# Altium integrated library Diode-SMD_V2.IntLib: 415 symbols (part 2 of 2) (continued)
## SK33_SMA
designator D?  Part Number: SK33SMA  (hidden comment: SK33_SMA)
Diode Schottky Rectifier 3Amp 30V; Manufacturer: Diotec; Value: SK33SMA; Package: SMA; EDM-PN: *; Text2: *; Text1: *; SAAB PN: *; DCE Part No: *
footprint SMA (SMA 5.6x2.95mm)
pins: 1 C, 2 A

## SK33_SMB
designator D?  Part Number: SK33SMB  (hidden comment: SK33_SMB)
Diode Schottky Rectifier 3Amp 30V; Manufacturer: Diotec; Value: SK33SMB; Package: SMB; EDM-PN: *; Text2: *; Text1: *; SAAB PN: *; DCE Part No: *
footprint SMB (SMB 4.75x3.94mm)
pins: 1 C, 2 A

## SK34_SMA
designator D?  Part Number: SK34SMA  (hidden comment: SK34_SMA)
Diode Schottky Rectifier 3Amp 40V; Manufacturer: Diotec; DCE Part No: 6996; EDM-PN: DIO71; Value: SK34SMA; Package: SMA; Text2: *; Text1: *; SAAB PN: *
footprint SMA (SMA 5.6x2.95mm)
pins: 1 C, 2 A

## SK34_SMB
designator D?  Part Number: SK34SMB  (hidden comment: SK34_SMB)
Diode Schottky Rectifier 3Amp 40V; Manufacturer: Diotec; Value: SK34SMB; Package: SMB; EDM-PN: *; Text2: *; Text1: *; SAAB PN: *; DCE Part No: *
footprint SMB (SMB 4.75x3.94mm)
pins: 1 C, 2 A

## SK34SMA-3G
designator D?
Diode Schottky Rectifier 40V 3Amp; Manufacturer: Diotec; DCE Part No: 6996; Package: SMA; EDM-PN: *; Text2: *; Text1: *; Value: SK34SMA-3G; SAAB PN: *; Part Number: SK34SMA-3G
footprint SMA (SMA 5.6x2.95mm)
pins: 1 C, 2 A

## SK35_SMA
designator D?  Part Number: SK35SMA  (hidden comment: SK35_SMA)
Diode Schottky Rectifier 3Amp 50V; Manufacturer: Diotec; Value: SK35SMA; Package: SMA; EDM-PN: *; Text2: *; Text1: *; SAAB PN: *; DCE Part No: *
footprint SMA (SMA 5.6x2.95mm)
pins: 1 C, 2 A

## SK35_SMB
designator D?  Part Number: SK35SMB  (hidden comment: SK35_SMB)
Diode Schottky Rectifier 3Amp 50V; Manufacturer: Diotec; Value: SK35SMB; Package: SMB; EDM-PN: *; Text2: *; Text1: *; SAAB PN: *; DCE Part No: *
footprint SMB (SMB 4.75x3.94mm)
pins: 1 C, 2 A

## SK36_SMA
designator D?  Part Number: SK36SMA  (hidden comment: SK36_SMA)
Diode Schottky Rectifier 3Amp 60V; Manufacturer: Diotec; EDM-PN: DIO238; Value: SK36SMA; Package: SMA; Text2: *; Text1: *; SAAB PN: *; DCE Part No: *
footprint SMA (SMA 5.6x2.95mm)
pins: 1 C, 2 A

## SK36_SMA-DNF
designator D?, comment value (SK36SMA)  (hidden comment: SK36_SMA)
Diode Schottky Rectifier 3Amp 60V - Do not Fit; Manufacturer: Diotec; Part Number: SK36SMA; Package: SMA; EDM-PN: *; Text2: *; Text1: *; SAAB PN: *; DCE Part No: *
footprint SMA (SMA 5.6x2.95mm)
pins: 1 C, 2 A

## SK36_SMB
designator D?  Part Number: SK36SMB  (hidden comment: SK36_SMB)
Diode Schottky Rectifier 3Amp 60V; Manufacturer: Diotec; Value: SK36SMB; Package: SMB; EDM-PN: *; Text2: *; Text1: *; SAAB PN: *; DCE Part No: *
footprint SMB (SMB 4.75x3.94mm)
pins: 1 C, 2 A

## SK38_SMA
designator D?  Part Number: SK38SMA  (hidden comment: SK38_SMA)
Diode Schottky Rectifier 3Amp 80V; Manufacturer: Diotec; Value: SK38SMA; Package: SMA; EDM-PN: *; Text2: *; Text1: *; SAAB PN: *; DCE Part No: *
footprint SMA (SMA 5.6x2.95mm)
pins: 1 C, 2 A

## SK38_SMB
designator D?  Part Number: SK38SMB  (hidden comment: SK38_SMB)
Diode Schottky Rectifier 3Amp 80V; Manufacturer: Diotec; Value: SK38SMB; Package: SMB; EDM-PN: *; Text2: *; Text1: *; SAAB PN: *; DCE Part No: *
footprint SMB (SMB 4.75x3.94mm)
pins: 1 C, 2 A

## SK53A-LTP_SMA
designator D?, comment SK53A-LTP
Diode Schottky Rectifier 5Amp 30V; Manufacturer: MCC; Package: SMA; EDM-PN: *; Text2: *; Text1: *; Value: SK53A-LTP; SAAB PN: *; Part Number: SK53A-LTP; DCE Part No: *
footprint SMA (SMA 5.6x2.95mm)
pins: 1 C, 2 A

## SK54_SMC
designator D?, comment SK54
Diode Schottky Rectifier 5Amp 40V; Manufacturer: Sangdest Micro; Package: SMC; EDM-PN: *; Text2: *; Text1: *; Value: SK54; SAAB PN: *; Part Number: SK54; DCE Part No: *
footprint SMC (Molded Diode, 2-Leads, Body 6.9x5.8mm, IPC Medium Density)
pins: 1 C, 2 A

## SK56-3G_SMB
designator D?, comment SK56-3G
Diode Schottky Rectifier 5Amp 60V; Manufacturer: Diotec; Package: SMB; EDM-PN: *; Text2: *; Text1: *; Value: SK56-3G; SAAB PN: *; Part Number: SK56-3G; DCE Part No: *
footprint SMB (SMB 4.75x3.94mm)
pins: 1 C, 2 A

## SK110-L_SMB
designator D?  Part Number: SK110-L  (hidden comment: SK110-L_SMB)
Diode Schottky Rectifier 1Amp 100V; Manufacturer: MCC; Package: SMB; EDM-PN: *; Text2: *; Text1: *; Value: SK110-L; SAAB PN: *; DCE Part No: *
footprint SMB (SMB 4.75x3.94mm)
pins: 1 C, 2 A

## SK110_SMA
designator D?  Part Number: SK110  (hidden comment: SK110_SMA)
Diode Schottky Rectifier 1Amp 100V; Manufacturer: Diotec; Value: SK110; Package: SMA; EDM-PN: *; Text2: *; Text1: *; SAAB PN: *; DCE Part No: *
footprint SMA (SMA 5.6x2.95mm)
pins: 1 C, 2 A

## SK110_SMB
designator D?
Diode Schottky Rectifier 1Amp 100V; Manufacturer: Various; DCE Part No: 2248; Package: SMB; EDM-PN: *; Text2: *; Text1: *; Value: SK110_SMB; SAAB PN: *; Part Number: SK110_SMB
footprint SMB (SMB 4.75x3.94mm)
pins: 1 C, 2 A

## SK220ATR_SMA
designator D?  Part Number: SK220ATR  (hidden comment: SK220ATR_SMA)
Diode Schottky Rectifier 2Amp 200V; Manufacturer: SMC Diode Solutions; Package: SMA; EDM-PN: *; Text2: *; Text1: *; Value: SK220ATR; SAAB PN: *; DCE Part No: *
footprint SMA (SMA 5.6x2.95mm)
pins: 1 C, 2 A

## SK310_SMA
designator D?, comment SK310SMA
Diode Schottky Rectifier 3Amp 100V; Manufacturer: Diotec; Package: SMA; EDM-PN: *; Text2: *; Text1: *; Value: SK310SMA; SAAB PN: *; Part Number: SK310SMA; DCE Part No: *
footprint SMA (SMA 5.6x2.95mm)
pins: 1 C, 2 A

## SK310_SMB
designator D?  Part Number: SK310SMB  (hidden comment: SK310_SMB)
Diode Schottky Rectifier 3Amp 100V; Manufacturer: Diotec; Value: SK310SMB; Package: SMB; EDM-PN: *; Text2: *; Text1: *; SAAB PN: *; DCE Part No: *
footprint SMB (SMB 4.75x3.94mm)
pins: 1 C, 2 A

## SK310B-LTP_SMB
designator D?, comment SK310B-LTP
Diode Schottky Rectifier 3Amp 100V; Manufacturer: MCC; Package: SMB; EDM-PN: *; Text2: *; Text1: *; Value: SK310B-LTP; SAAB PN: *; Part Number: SK310B-LTP; DCE Part No: *
footprint SMB (SMB 4.75x3.94mm)
pins: 1 C, 2 A

## SM4007
designator D?
Diode Rectifier 1Amp 1000V; Manufacturer: Diotec; EDM-PN: DIO19; Package: DO-213AB; Text2: *; Text1: *; Value: SM4007; SAAB PN: *; Part Number: SM4007; DCE Part No: *
footprint DO-213AB (DO-213AB 5.0x2.5mm)
pins: 1 C, 2 A

## SM4007-DNF
designator D?  value (SM4007)  (hidden comment: SM4007-DNF)
Diode Rectifier 1Amp 1000V - Do no Fit; Manufacturer: Diotec; Part Number: DNF - SM4007; EDM-PN: DIO19; Package: DO-213AB; Text2: *; Text1: *; SAAB PN: *; DCE Part No: *
footprint DO-213AB (DO-213AB 5.0x2.5mm)
pins: 1 C, 2 A

## SM5408
designator D?
Diode Rectifier 3Amp 1000V; Manufacturer: Diotec; EDM-PN: DIO105; Package: DO-213AB; Text2: *; Text1: *; Value: SM5408; SAAB PN: *; Part Number: SM5408; DCE Part No: *
footprint DO-213AB (DO-213AB 5.0x2.5mm)
pins: 1 C, 2 A

## SM5818
designator D?
Diode Rectifier 1Amp 30V; Manufacturer: Diotec; Package: DO-213AB; EDM-PN: *; Text2: *; Text1: *; Value: SM5818; SAAB PN: *; Part Number: SM5818; DCE Part No: *
footprint DO-213AB (DO-213AB 5.0x2.5mm)
pins: 1 C, 2 A

## SM5818PL-TP_SOD123
designator D?, comment SM5818PL-TP
Diode Schottky Power Rectifier 3A 40V; Manufacturer: MCC; Package: SOD123FL; EDM-PN: *; Text2: *; Text1: *; Value: SM5818PL-TP; SAAB PN: *; Part Number: SM5818PL-TP; DCE Part No: *
footprint SOD123FL (SOD 123FL 2.85x1.7mm)
pins: 1 C, 2 A

## SM5819
designator D?
Diode Rectifier 1Amp 40V; Manufacturer: Diotec; EDM-PN: DIO4; Package: DO-213AB; Text2: *; Text1: *; Value: SM5819; SAAB PN: *; DCE Part No: *; Part Number: SM5819
footprint DO-213AB (DO-213AB 5.0x2.5mm)
pins: 1 C, 2 A

## SM5819-DNF
designator D?, comment value (SM5819)  (hidden comment: SM5819)
Diode Rectifier 1Amp 40V - Do not Fit; Manufacturer: Diotec; Part Number: DNF - SM5819; Package: DO-213AB; EDM-PN: *; Text2: *; Text1: *; SAAB PN: *; DCE Part No: *
footprint DO-213AB (DO-213AB 5.0x2.5mm)
pins: 1 C, 2 A

## SMLJ60S10
designator D?
Diode Rectifier 6Amp 1000V; Manufacturer: MCC; Package: DO-214AB; EDM-PN: *; Text2: *; Text1: *; Value: SMLJ60S10; SAAB PN: *; Part Number: SMLJ60S10; DCE Part No: *
footprint DO-214AB (Molded Diode, 2-Leads, Body 6.9x5.8mm, IPC Medium Density)
pins: 1 C, 2 A

## SMS2100
designator D?
Diode Schottky Rectifier 2Amp 100V; Manufacturer: Diotec; EDM-PN: DIO15; Package: DO-213AB; Text2: *; Text1: *; Value: SMS2100; SAAB PN: *; Part Number: SMS2100; DCE Part No: *
footprint DO-213AB (DO-213AB 5.0x2.5mm)
pins: 1 C, 2 A

## SS5P4-M3/86A_TO-277A
designator D?, comment SS5P4-M3/86A
Diode Schottky 40V 5A; Manufacturer: Vishay; Package: TO-277A; EDM-PN: *; Text2: *; Text1: *; Value: SS5P4-M3/86A; SAAB PN: *; DCE Part No: *; Part Number: SS5P4-M3/86A
footprint TO-277A (TO-277A 4.3x6.1mm)
pins: 1 A, 2 A, 3 C

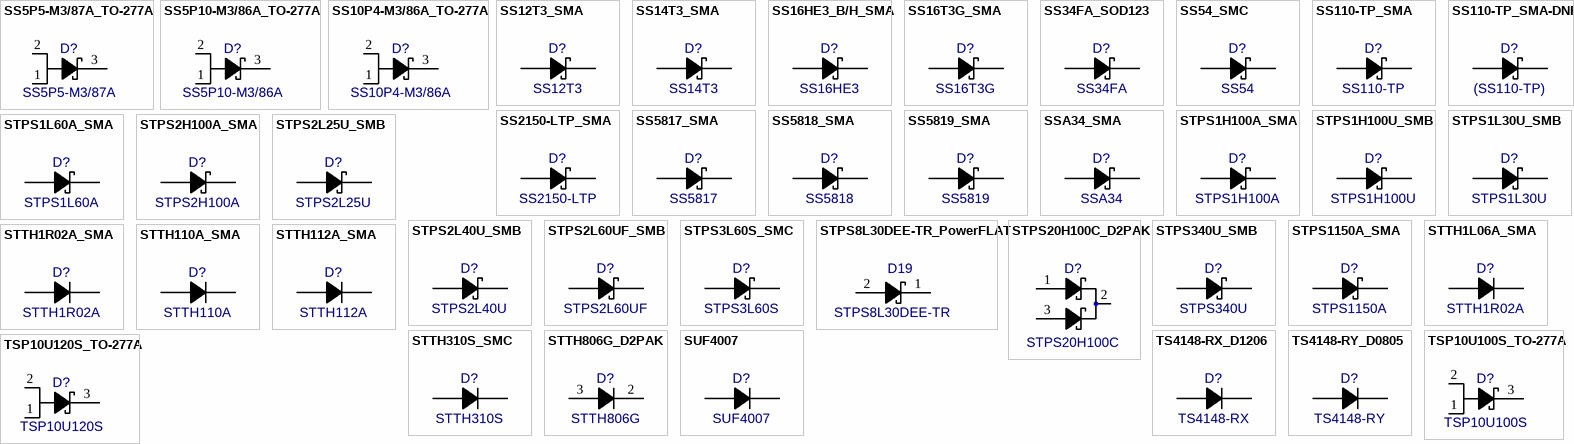
[diagram p9: symbols SS5P5-M3/87A_TO-277A to TSP10U120S_TO-277A]

## SS5P5-M3/87A_TO-277A
designator D?, comment SS5P5-M3/87A
Diode Schottky 50V 5A; Manufacturer: Vishay; Package: TO-277A; EDM-PN: *; Text2: *; Text1: *; Value: SS5P5-M3/87A; Reutech PN: *; SAAB PN: *; Part Number: SS5P5-M3/87A; DCE Part No: *
footprint TO-277A (TO-277A 4.3x6.1mm)
pins: 1 A, 2 A, 3 C

## SS5P10-M3/86A_TO-277A
designator D?, comment SS5P10-M3/86A
Diode Schottky 100V 5A; Manufacturer: Vishay; Package: TO-277A; EDM-PN: *; Text2: *; Text1: *; Value: SS5P10-M3/86A; SAAB PN: *; Part Number: SS5P10-M3/86A; DCE Part No: *
footprint TO-277A (TO-277A 4.3x6.1mm)
pins: 1 A, 2 A, 3 C

## SS10P4-M3/86A_TO-277A
designator D?, comment SS10P4-M3/86A
Diode Schottky 40V 10A; Manufacturer: Vishay; Value: SS10P4-M3/86A_TO-277A; Reutech PN: 5961-ST-0036; Package: TO-277A; EDM-PN: *; Text2: *; Text1: *; SAAB PN: *; Part Number: SS10P4-M3/86A; DCE Part No: *
footprint TO-277A (TO-277A 4.3x6.1mm)
pins: 1 A, 2 A, 3 C

## SS12T3_SMA
designator D?, comment SS12T3
Diode Schottky Power Rectifier 1A 20V; Manufacturer: On Semi; Package: SMA; EDM-PN: *; Text2: *; Text1: *; Value: SS12T3; SAAB PN: *; Part Number: SS12T3; DCE Part No: *
footprint SMA (SMA 5.6x2.95mm)
pins: 1 C, 2 A

## SS14T3_SMA
designator D?, comment SS14T3
Diode Schottky Power Rectifier 1A 40V; Manufacturer: On Semi; Package: SMA; EDM-PN: *; Text2: *; Text1: *; Value: SS14T3; SAAB PN: *; Part Number: SS14T3; DCE Part No: *
footprint SMA (SMA 5.6x2.95mm)
pins: 1 C, 2 A

## SS16HE3_B/H_SMA
designator D?, comment value SS16HE3  (hidden comment: SS16HE3_B/H)
Diode Schottky Rectifier 60V 1A; Manufacturer: Vishay; Package: SMA; EDM-PN: *; Text2: *; Text1: *; SAAB PN: *; Part Number: SS16HE3_B/H; DCE Part No: *
footprint SMA (SMA 5.6x2.95mm)
pins: 1 C, 2 A

## SS16T3G_SMA
designator D?, comment SS16T3G
Diode Schottky Rectifier 60V 1A; Manufacturer: On Semi; Package: SMA; EDM-PN: *; Text2: *; Text1: *; Value: SS16T3G; SAAB PN: *; Part Number: SS16T3G; DCE Part No: *
footprint SMA (SMA 5.6x2.95mm)
pins: 1 C, 2 A

## SS34FA_SOD123
designator D?, comment SS34FA
Diode Schottky Power Rectifier 3A 40V; Manufacturer: Fairchild; Package: SOD123FA; EDM-PN: *; Text2: *; Text1: *; Value: SS34FA; SAAB PN: *; Part Number: SS34FA; DCE Part No: *
footprint SOD123FA (SOD 123FA 2.85x1.7mm)
pins: 1 C, 2 A

## SS54_SMC
designator D?  Part Number: SS54  (hidden comment: SS54_SMC)
Diode Schottky Rectifier 5Amp 40V; Manufacturer: Multicomp; Value: SS54; Package: SMC; EDM-PN: *; Text2: *; Text1: *; SAAB PN: *; DCE Part No: *
footprint SMC (Molded Diode, 2-Leads, Body 6.9x5.8mm, IPC Medium Density)
pins: 1 C, 2 A

## SS110-TP_SMA
designator D?, comment SS110-TP
Diode Schottky Rectifier 1Amp 100V; Manufacturer: MCC; Package: SMA; EDM-PN: *; Text2: *; Text1: *; Value: SS110-TP; SAAB PN: *; Part Number: SS110-TP; DCE Part No: *
footprint SMA (SMA 5.6x2.95mm)
pins: 1 C, 2 A

## SS110-TP_SMA-DNF
designator D?, comment value (SS110-TP)  (hidden comment: SS110-TP)
Diode Schottky Rectifier 1Amp 100V - Do not Fit; Manufacturer: MCC; Part Number: DNF - SS110-TP; Package: SMA; EDM-PN: *; Text2: *; Text1: *; SAAB PN: *; DCE Part No: *
footprint SMA (SMA 5.6x2.95mm)
pins: 1 C, 2 A

## SS2150-LTP_SMA
designator D?, comment SS2150-LTP
Diode Schottky Rectifier 2Amp 150V; Manufacturer: MCC; Package: SMA; EDM-PN: *; Text2: *; Text1: *; Value: SS2150-LTP; SAAB PN: *; Part Number: SS2150-LTP; DCE Part No: *
footprint SMA (SMA 5.6x2.95mm)
pins: 1 C, 2 A

## SS5817_SMA
designator D?, comment SS5817
Diode Schottky Barrier Rectifier 1A 20V; Manufacturer: Semtech; Package: SMA; EDM-PN: *; Text2: *; Text1: *; Value: SS5817; SAAB PN: *; Part Number: SS5817; DCE Part No: *
footprint SMA (SMA 5.6x2.95mm)
pins: 1 C, 2 A

## SS5818_SMA
designator D?, comment SS5818
Diode Schottky Barrier Rectifier 1A 30V; Manufacturer: Semtech; Package: SMA; EDM-PN: *; Text2: *; Text1: *; Value: SS5818; SAAB PN: *; Part Number: SS5818; DCE Part No: *
footprint SMA (SMA 5.6x2.95mm)
pins: 1 C, 2 A

## SS5819_SMA
designator D?, comment SS5819
Diode Schottky Barrier Rectifier 1A 40V; Manufacturer: Semtech; Package: SMA; EDM-PN: *; Text2: *; Text1: *; Value: SS5819; SAAB PN: *; Part Number: SS5819; DCE Part No: *
footprint SMA (SMA 5.6x2.95mm)
pins: 1 C, 2 A

## SSA34_SMA
designator D?  Part Number: SSA34  (hidden comment: SSA34_SMA)
Diode Schottky Rectifier 3Amp 40V; Manufacturer: Vishay; Package: SMA; EDM-PN: *; Text2: *; Text1: *; Value: SSA34_SMA; SAAB PN: *; DCE Part No: *
footprint SMA (SMA 5.6x2.95mm)
pins: 1 C, 2 A

## STPS1H100A_SMA
designator D?, comment STPS1H100A
Diode Schottky Rectifier 1Amp 100V; Manufacturer: ST; Package: SMA; EDM-PN: *; Text2: *; Text1: *; Value: STPS1H100A; SAAB PN: *; Part Number: STPS1H100A; DCE Part No: *
footprint SMA (SMA 5.6x2.95mm)
pins: 1 C, 2 A

## STPS1H100U_SMB
designator D?, comment STPS1H100U
Diode Schottky Power Rectifier 1A 100V; Manufacturer: ST; Package: SMB; EDM-PN: *; Text2: *; Text1: *; Value: STPS1H100U; SAAB PN: *; Part Number: STPS1H100U; DCE Part No: *
footprint SMB (SMB 4.75x3.94mm)
pins: 1 C, 2 A

## STPS1L30U_SMB
designator D?, comment STPS1L30U
Diode Schottky Power Rectifier 1A 30V; Manufacturer: ST; Package: SMB; EDM-PN: *; Text2: *; Text1: *; Value: STPS1L30U; SAAB PN: *; Part Number: STPS1L30U; DCE Part No: *
footprint SMB (SMB 4.75x3.94mm)
pins: 1 C, 2 A

## STPS1L60A_SMA
designator D?, comment STPS1L60A
Diode Schottky Rectifier 1Amp 60V; Manufacturer: ST; Package: SMA; EDM-PN: *; Text2: *; Text1: *; Value: STPS1L60A; SAAB PN: *; Part Number: STPS1L60A; DCE Part No: *
footprint SMA (SMA 5.6x2.95mm)
pins: 1 C, 2 A

## STPS2H100A_SMA
designator D?, comment STPS2H100A
Diode Schottky Rectifier 2Amp 100V; Manufacturer: ST; Package: SMA; EDM-PN: *; Text2: *; Text1: *; Value: STPS2H100A; SAAB PN: *; Part Number: STPS2H100A; DCE Part No: *
footprint SMA (SMA 5.6x2.95mm)
pins: 1 C, 2 A

## STPS2L25U_SMB
designator D?, comment STPS2L25U
Diode Schottky Power Rectifier 2A 25V; Manufacturer: ST; Package: SMB; EDM-PN: *; Text2: *; Text1: *; Value: STPS2L25U; SAAB PN: *; Part Number: STPS2L25U; DCE Part No: *
footprint SMB (SMB 4.75x3.94mm)
pins: 1 C, 2 A

## STPS2L40U_SMB
designator D?, comment STPS2L40U
Diode Schottky Power Rectifier 2A 40V; Manufacturer: ST; Package: SMB; EDM-PN: *; Text2: *; Text1: *; Value: STPS2L40U; SAAB PN: *; Part Number: STPS2L40U; DCE Part No: *
footprint SMB (SMB 4.75x3.94mm)
pins: 1 C, 2 A

## STPS2L60UF_SMB
designator D?, comment STPS2L60UF
Diode Schottky Power Rectifier 2A 60V; Manufacturer: ST; Package: SMB; EDM-PN: *; Text2: *; Text1: *; Value: STPS2L60UF; SAAB PN: *; Part Number: STPS2L60UF; DCE Part No: *
footprint SMB (SMB 4.75x3.94mm)
pins: 1 C, 2 A

## STPS3L60S_SMC
designator D?, comment STPS3L60S
Diode Schottky Power Rectifier 60V 3A; Manufacturer: STM; EDM-PN: DIO306; Package: SMC; Text2: *; Text1: *; Value: STPS3L60S; SAAB PN: *; Part Number: STPS3L60S; DCE Part No: *
footprint SMC (Molded Diode, 2-Leads, Body 6.9x5.8mm, IPC Medium Density)
pins: 1 C, 2 A

## STPS8L30DEE-TR_PowerFLAT
designator D19, comment STPS8L30DEE-TR
Diode Schottky Rectifier 8A 30V; Manufacturer: STM; Package: PowerFLAT-3.3x3.3-3L; EDM-PN: *; Text2: *; Text1: *; Value: STPS8L30DEE-TR; SAAB PN: *; Part Number: STPS8L30DEE-TR; DCE Part No: *
footprint PowerFLAT-3.3x3.3-3L (PowerFLAT 8  3.3x3.3mm)
pins: 1 C, 2 A

## STPS20H100C_D2PAK
designator D?, comment STPS20H100C
Diode Schottky 100V 2x10A; Manufacturer: ST; Package: D2PAK; EDM-PN: *; Text2: *; Text1: *; Value: STPS20H100C; SAAB PN: *; Part Number: STPS20H100C; DCE Part No: *
footprint D2PAK (D2-PAK, 3-Pads, Body 9.4x10.4mm (max), IPC Medium Density)
pins: 1 A1, 2 C, 3 A2

## STPS340U_SMB
designator D?, comment STPS340U
Diode Schottky Power Rectifier 3A 40V; Manufacturer: ST; Package: SMB; EDM-PN: *; Text2: *; Text1: *; Value: STPS340U; SAAB PN: *; Part Number: STPS340U; DCE Part No: *
footprint SMB (SMB 4.75x3.94mm)
pins: 1 C, 2 A

## STPS1150A_SMA
designator D?, comment STPS1150A
Diode Schottky Rectifier 1Amp 150V; Manufacturer: ST; Package: SMA; EDM-PN: *; Text2: *; Text1: *; Value: STPS1150A; SAAB PN: *; Part Number: STPS1150A; DCE Part No: *
footprint SMA (SMA 5.6x2.95mm)
pins: 1 C, 2 A

## STTH1L06A_SMA
designator D?, comment Part Number: STTH1R02A  (hidden comment: STTH1L06A)
Diode UltraFast 1Amp 600V; Manufacturer: ST; Value: STTH1R02A; Package: SMA; EDM-PN: *; Text2: *; Text1: *; SAAB PN: *; DCE Part No: *
footprint SMA (SMA 5.6x2.95mm)
pins: 1 C, 2 A

## STTH1R02A_SMA
designator D?, comment STTH1R02A
Diode UltraFast Recovery 1.5Amp 200V; Manufacturer: ST; Package: SMA; EDM-PN: *; Text2: *; Text1: *; Value: STTH1R02A; SAAB PN: *; Part Number: STTH1R02A; DCE Part No: *
footprint SMA (SMA 5.6x2.95mm)
pins: 1 C, 2 A

## STTH110A_SMA
designator D?, comment STTH110A
Diode UltraFast Rectifier 1Amp 1000V; Manufacturer: ST; Package: SMA; EDM-PN: *; Text2: *; Text1: *; Value: STTH110A; SAAB PN: *; Part Number: STTH110A; DCE Part No: *
footprint SMA (SMA 5.6x2.95mm)
pins: 1 C, 2 A

## STTH112A_SMA
designator D?, comment STTH112A
Diode UltraFast Rectifier 1Amp 1200V; Manufacturer: ST; Reutech PN: 5961-DD-0034; Package: SMA; EDM-PN: *; Text2: *; Text1: *; Value: STTH112A; SAAB PN: *; Part Number: STTH112A; DCE Part No: *
footprint SMA (SMA 5.6x2.95mm)
pins: 1 C, 2 A

## STTH310S_SMC
designator D?, comment STTH310S
Diode Ultrafast Rectifier 3Amp 1000V; Manufacturer: ST; Package: SMC; EDM-PN: *; Text2: *; Text1: *; Value: STTH310S; SAAB PN: *; Part Number: STTH310S; DCE Part No: *
footprint SMC (Molded Diode, 2-Leads, Body 6.9x5.8mm, IPC Medium Density)
pins: 1 C, 2 A

## STTH806G_D2PAK
designator D?, comment STTH806G
Diode Ulttrafast Rectifier 8Amp 600V; Manufacturer: ST; Package: D2PAK; EDM-PN: *; Text2: *; Text1: *; Value: STTH806G; SAAB PN: *; Part Number: STTH806G; DCE Part No: *
footprint D2PAK (D2-PAK, 3-Pads, Body 9.4x10.4mm (max), IPC Medium Density)
pins: 2 C, 3 A

## SUF4007
designator D?
Diode Rectifier 1Amp 1000V; Manufacturer: Diotec; Package: DO-213AB; EDM-PN: *; Text2: *; Text1: *; Value: SUF4007; SAAB PN: *; Part Number: SUF4007; DCE Part No: *
footprint DO-213AB (DO-213AB 5.0x2.5mm)
pins: 1 C, 2 A

## TS4148-RX_D1206
designator D?, comment TS4148-RX
Diode High Speed Switching 400mW; Manufacturer: Taiwan Semi; Package: D1206-MP; EDM-PN: *; Text2: *; Text1: *; Value: TS4148-RX; SAAB PN: *; Part Number: TS4148-RX; DCE Part No: *
footprint D1206-MP (D1206-MP 3.4x1.7mm)
pins: 1 C, 2 A

## TS4148-RY_D0805
designator D?, comment TS4148-RY
Diode High Speed Switching 400mW; Manufacturer: Taiwan Semi; Package: D0805-MP; EDM-PN: *; Text2: *; Text1: *; Value: TS4148-RY; SAAB PN: *; Part Number: TS4148-RY; DCE Part No: *
footprint D0805-MP (D0805-MP 2.0x1.25mm)
pins: 1 C, 2 A

## TSP10U100S_TO-277A
designator D?, comment TSP10U100S
Diode Schottky (100Volt 10A); Manufacturer: Taiwan Semi; Package: TO-277A; EDM-PN: *; Text2: *; Text1: *; Value: TSP10U100S; SAAB PN: *; Part Number: TSP10U100S; DCE Part No: *
footprint TO-277A (TO-277A 4.3x6.1mm)
pins: 1 A, 2 A, 3 C

## TSP10U120S_TO-277A
designator D?, comment TSP10U120S
Diode Schottky (120Volt 10A); Manufacturer: Taiwan Semi; Package: TO-277A; EDM-PN: *; Text2: *; Text1: *; Value: TSP10U120S; SAAB PN: *; Part Number: TSP10U120S; DCE Part No: *
footprint TO-277A (TO-277A 4.3x6.1mm)
pins: 1 A, 2 A, 3 C

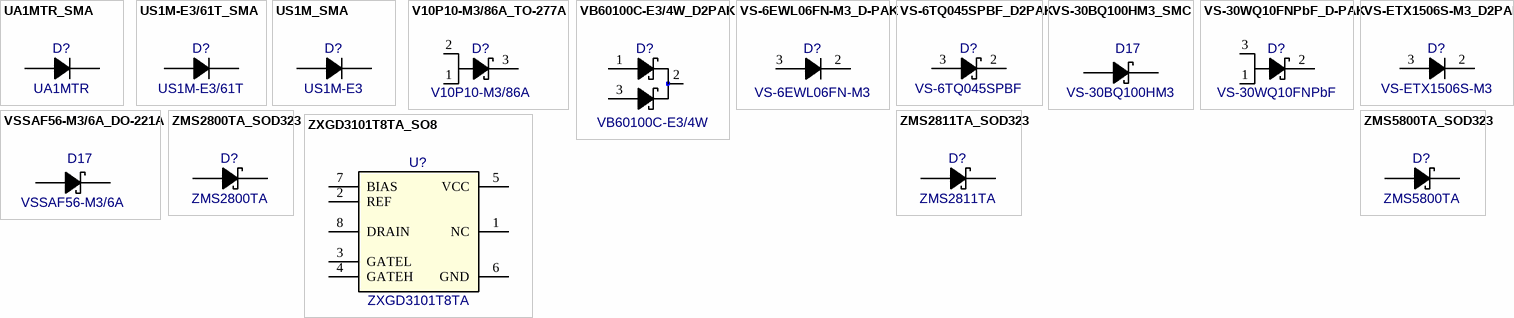
[diagram p10: symbols UA1MTR_SMA to ZXGD3101T8TA_SO8]

## UA1MTR_SMA
designator D?, comment UA1MTR
Diode Ultrafast Avalanche 1000V 1A; Manufacturer: SMC; Package: SMA; EDM-PN: *; Text2: *; Text1: *; Value: UA1MTR; SAAB PN: *; Part Number: UA1MTR; DCE Part No: *
footprint SMA (SMA 5.6x2.95mm)
pins: 1 C, 2 A

## US1M-E3/61T_SMA
designator D?, comment US1M-E3/61T
Diode Ultrafast Rectifier 1000V 1A; Manufacturer: Vishay; EDM-PN: DIO196; Package: SMA; Text2: *; Text1: *; Value: US1M-E3/61T; SAAB PN: *; Part Number: US1M-E3/61T; DCE Part No: *
footprint SMA (SMA 5.6x2.95mm)
pins: 1 C, 2 A

## US1M_SMA
designator D?, comment Part Number: US1M-E3  (hidden comment: US1M)
Diode Ultrafast Rectifier 1000V 1A; Manufacturer: Vishay; EDM-PN: DIO196; Package: SMA; Text2: *; Text1: *; Value: US1M; SAAB PN: *; DCE Part No: *
footprint SMA (SMA 5.6x2.95mm)
pins: 1 C, 2 A

## V10P10-M3/86A_TO-277A
designator D?, comment V10P10-M3/86A
Diode Schottky (100Volt 10A); Manufacturer: Vishay; EDM-PN: DIO254; Reutech PN: 5961-ST-0045; Package: TO-277A; Text2: *; Text1: *; Value: V10P10-M3/86A; SAAB PN: *; DCE Part No: *; Part Number: V10P10-M3/86A
footprint TO-277A (TO-277A 4.3x6.1mm)
pins: 1 A, 2 A, 3 C

## VB60100C-E3/4W_D2PAK
designator D?, comment VB60100C-E3/4W
Diode Schottky Dual 100V 30A; Manufacturer: Vishay; Reutech PN: 5961-ST-0051; Package: D2PAK; EDM-PN: *; Text2: *; Text1: *; Value: VB60100C-E3/4W; SAAB PN: *; Part Number: VB60100C-E3/4W; DCE Part No: *
footprint D2PAK (D2-PAK, 3-Pads, Body 9.4x10.4mm (max), IPC Medium Density)
pins: 1 A1, 2 C, 3 A2

## VS-6EWL06FN-M3_D-PAK
designator D?, comment VS-6EWL06FN-M3
Diode Ultralow VF Ultrafast Rectifier 600Volt 6A; Manufacturer: Vishay; Package: D-PAK; EDM-PN: *; Text2: *; Text1: *; Value: VS-6EWL06FN-M3; SAAB PN: *; DCE Part No: *; Part Number: VS-6EWL06FN-M3
footprint D-PAK (D-Pak 6.73x6.22mm)
pins: 2 C, 3 A

## VS-6TQ045SPBF_D2PAK
designator D?, comment VS-6TQ045SPBF
Diode Schottky Rectifier 6Amp 45V; Manufacturer: Vishay; Package: D2PAK; EDM-PN: *; Text2: *; Text1: *; Value: VS-6TQ045SPBF; SAAB PN: *; DCE Part No: *; Part Number: VS-6TQ045SPBF
footprint D2PAK (D2-PAK, 3-Pads, Body 9.4x10.4mm (max), IPC Medium Density)
pins: 2 C, 3 A

## VS-30BQ100HM3_SMC
designator D17, comment VS-30BQ100HM3
Diode Schottky Rectifier 3Amp 100V; Manufacturer: Vishay; Package: SMC; EDM-PN: *; Text2: *; Text1: *; Value: VS-30BQ100HM3; SAAB PN: *; Part Number: VS-30BQ100HM3; DCE Part No: *
footprint SMC (Molded Diode, 2-Leads, Body 6.9x5.8mm, IPC Medium Density)
pins: 1 C, 2 A

## VS-30WQ10FNPbF_D-PAK
designator D?, comment VS-30WQ10FNPbF
Diode Schottky 100Volt 3.5A; Manufacturer: Vishay; Package: D-PAK; EDM-PN: *; Text2: *; Text1: *; Value: VS-30WQ10FNPbF; SAAB PN: *; DCE Part No: *; Part Number: VS-30WQ10FNPbF
footprint D-PAK (D-Pak 6.73x6.22mm)
pins: 1 A, 2 C, 3 A

## VS-ETX1506S-M3_D2PAK
designator D?, comment VS-ETX1506S-M3
Diode Hyperfast Rectifier 15Amp 600V; Manufacturer: Vishay; Package: D2PAK; EDM-PN: *; Text2: *; Text1: *; Value: VS-ETX1506S-M3; SAAB PN: *; Part Number: VS-ETX1506S-M3; DCE Part No: *
footprint D2PAK (D2-PAK, 3-Pads, Body 9.4x10.4mm (max), IPC Medium Density)
pins: 2 C, 3 A

## VSSAF56-M3/6A_DO-221A
designator D17, comment VSSAF56-M3/6A
Diode Schottky Rectifier 3Amp 60V; Manufacturer: Vishay; Package: DO-221AC; EDM-PN: *; Text2: *; Text1: *; Value: VSSAF56-M3/6A; SAAB PN: *; Part Number: VSSAF56-M3/6A; DCE Part No: *
footprint DO-221AC (DO-221AC 4.25x2.6mm)
pins: 1 C, 2 A

## ZMS2800TA_SOD323
designator D?, comment ZMS2800TA
Diode Schottky Barrier; Manufacturer: Diodes; Package: SOD323; EDM-PN: *; Text2: *; Text1: *; Value: ZMS2800TA; SAAB PN: *; Part Number: ZMS2800TA; DCE Part No: *
footprint SOD323 (Diode, SOD323 2-Leads, Body 1.7x1.25mm, IPC Medium Density)
pins: 1 C, 2 A

## ZMS2811TA_SOD323
designator D?, comment ZMS2811TA
Diode Schottky Barrier; Manufacturer: Diodes; Package: SOD323; EDM-PN: *; Text2: *; Text1: *; Value: ZMS2811TA; SAAB PN: *; Part Number: ZMS2811TA; DCE Part No: *
footprint SOD323 (Diode, SOD323 2-Leads, Body 1.7x1.25mm, IPC Medium Density)
pins: 1 C, 2 A

## ZMS5800TA_SOD323
designator D?, comment ZMS5800TA
Diode Schottky Barrier; Manufacturer: Diodes; Package: SOD323; EDM-PN: *; Text2: *; Text1: *; Value: ZMS5800TA; SAAB PN: *; Part Number: ZMS5800TA; DCE Part No: *
footprint SOD323 (Diode, SOD323 2-Leads, Body 1.7x1.25mm, IPC Medium Density)
pins: 1 C, 2 A

## ZXGD3101T8TA_SO8
designator U?, comment ZXGD3101T8TA
IC Rectifier Controller; Manufacturer: Zetex; Value: ZXGD3101T8TA_SO8; Package: SO8; EDM-PN: *; Text2: *; Text1: *; SAAB PN: *; Part Number: ZXGD3101T8TA; DCE Part No: *
footprint Diode-SM8 (SM8 3.7x6.7mm)
pins: 1 NC, 2 REF, 3 GATEL, 4 GATEH, 5 VCC (power), 6 GND (power), 7 BIAS, 8 DRAIN